# Altium schematic symbol library CUSTOM SCH - Copy.SchLib: 494 symbols (part 3 of 6) (continued)
## RK860 (continued)
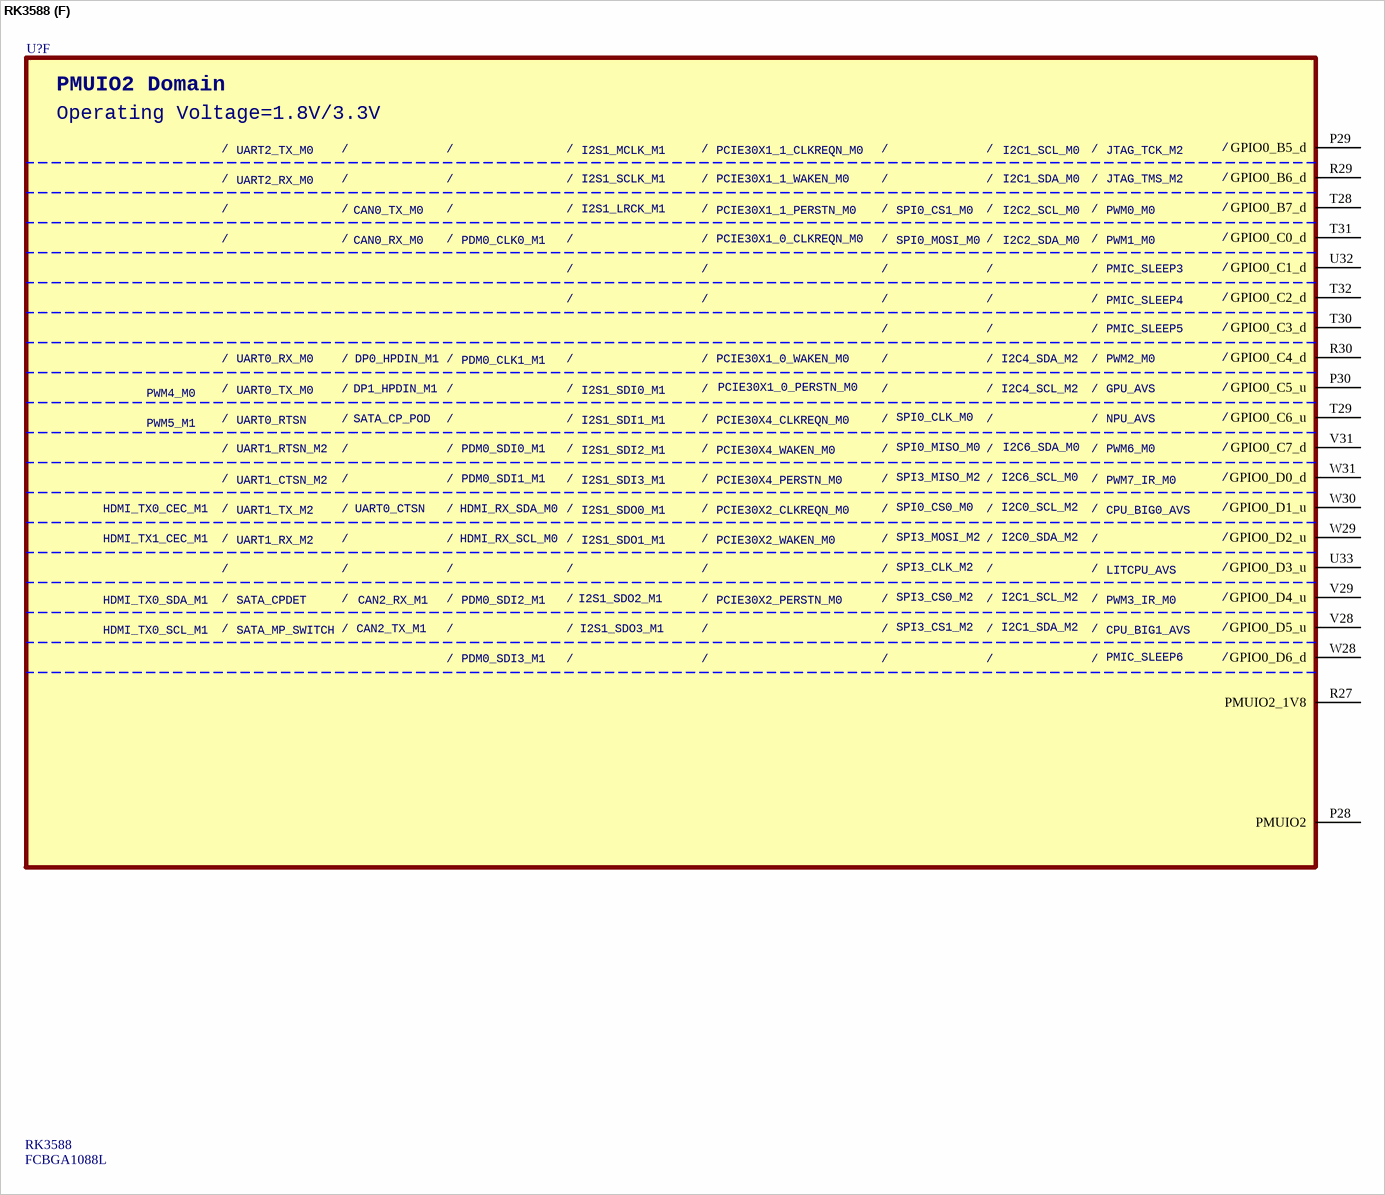
[diagram p25: symbol RK3588]

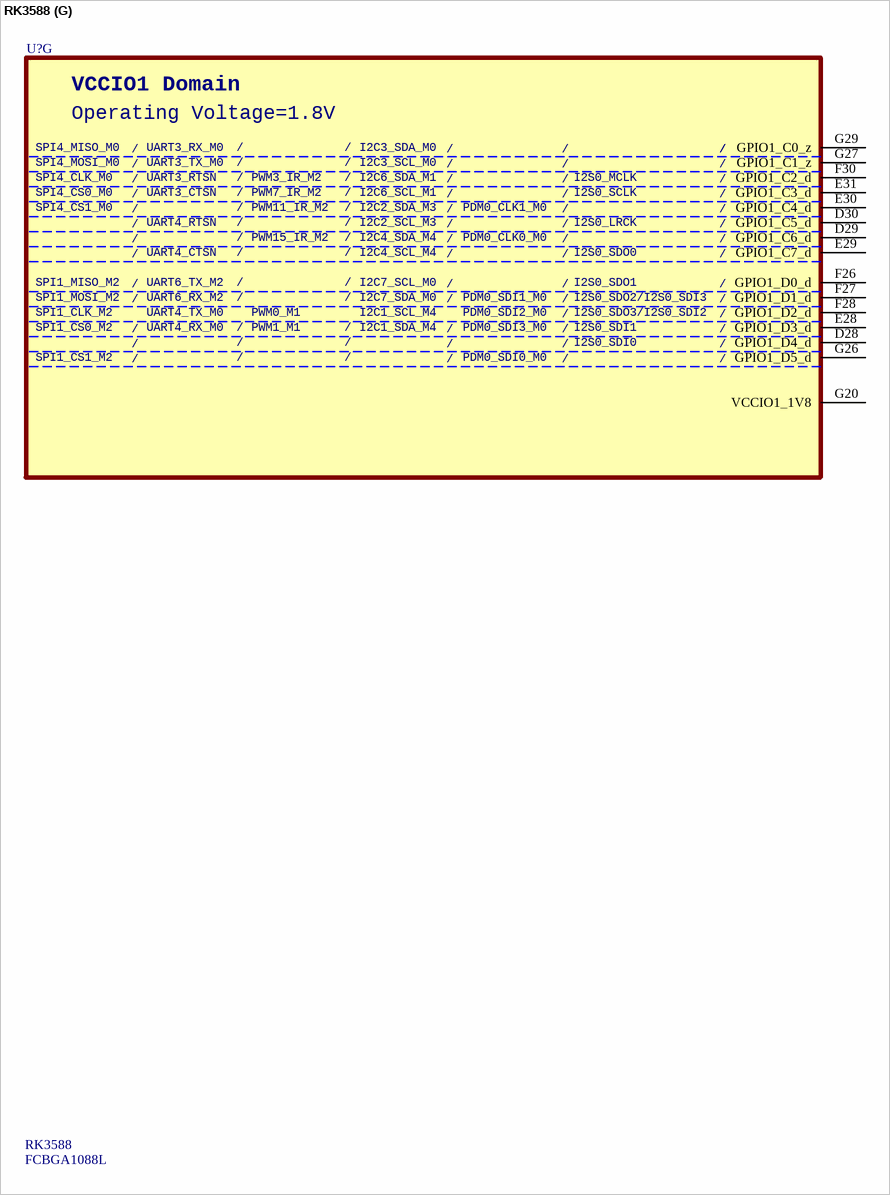
[diagram p26: symbol RK3588]

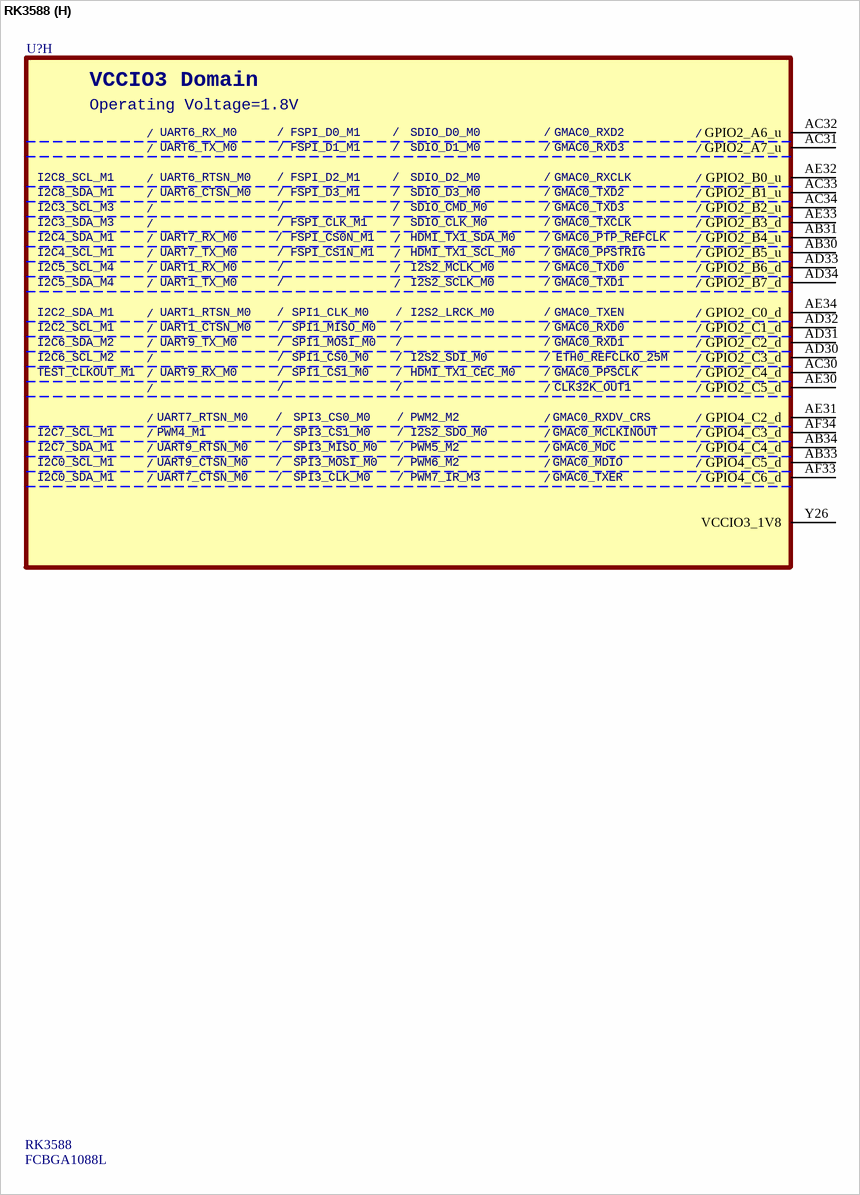
[diagram p27: symbol RK3588]

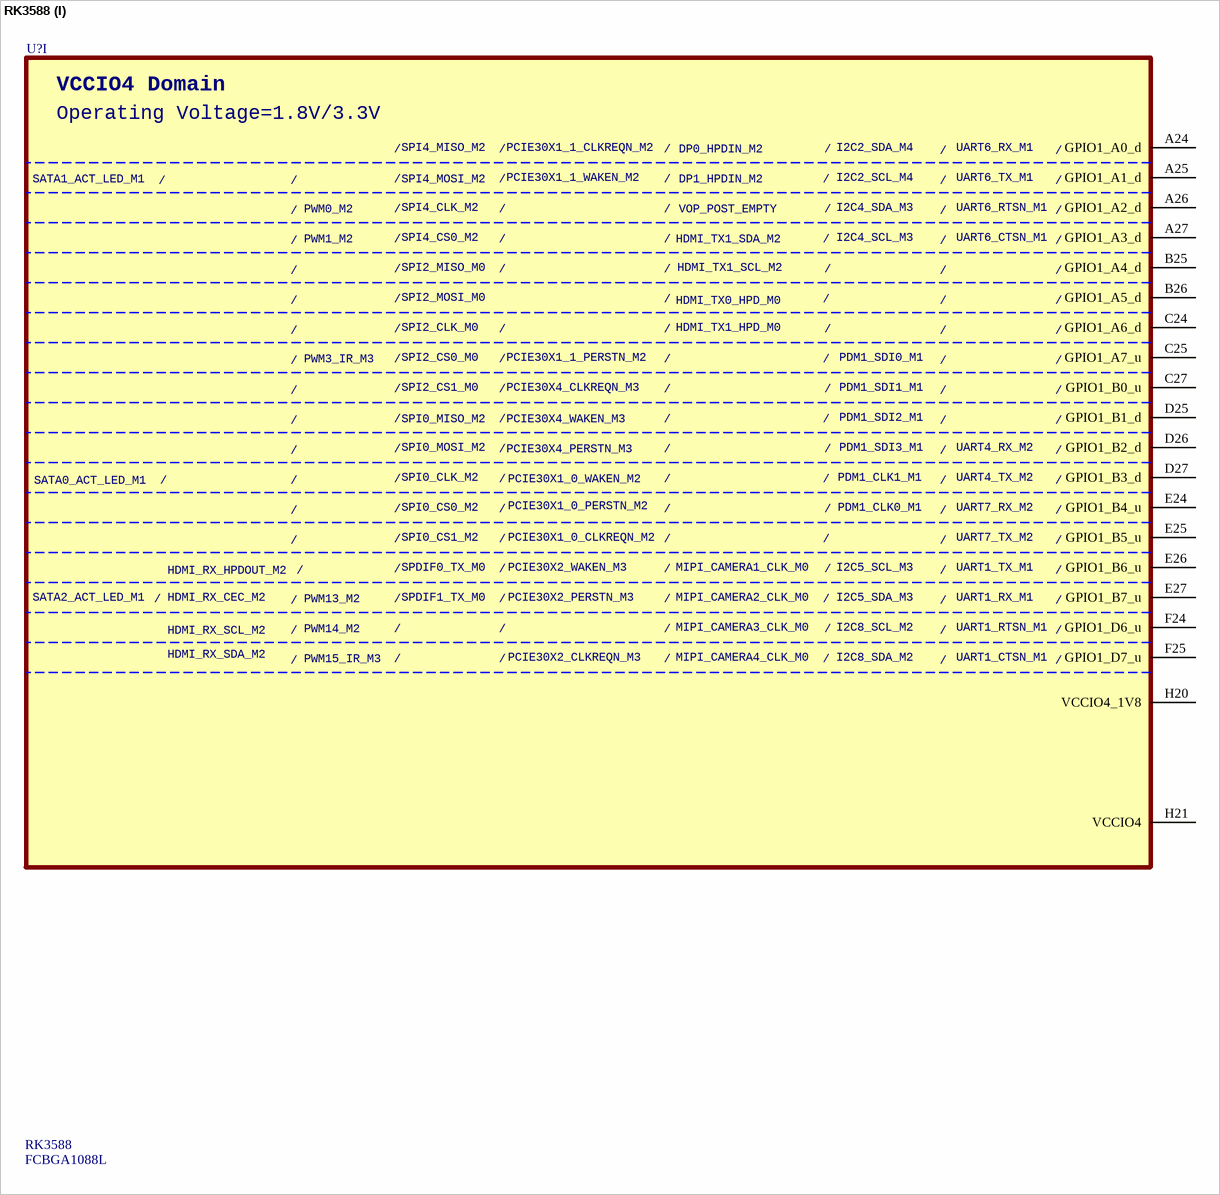
[diagram p28: symbol RK3588]

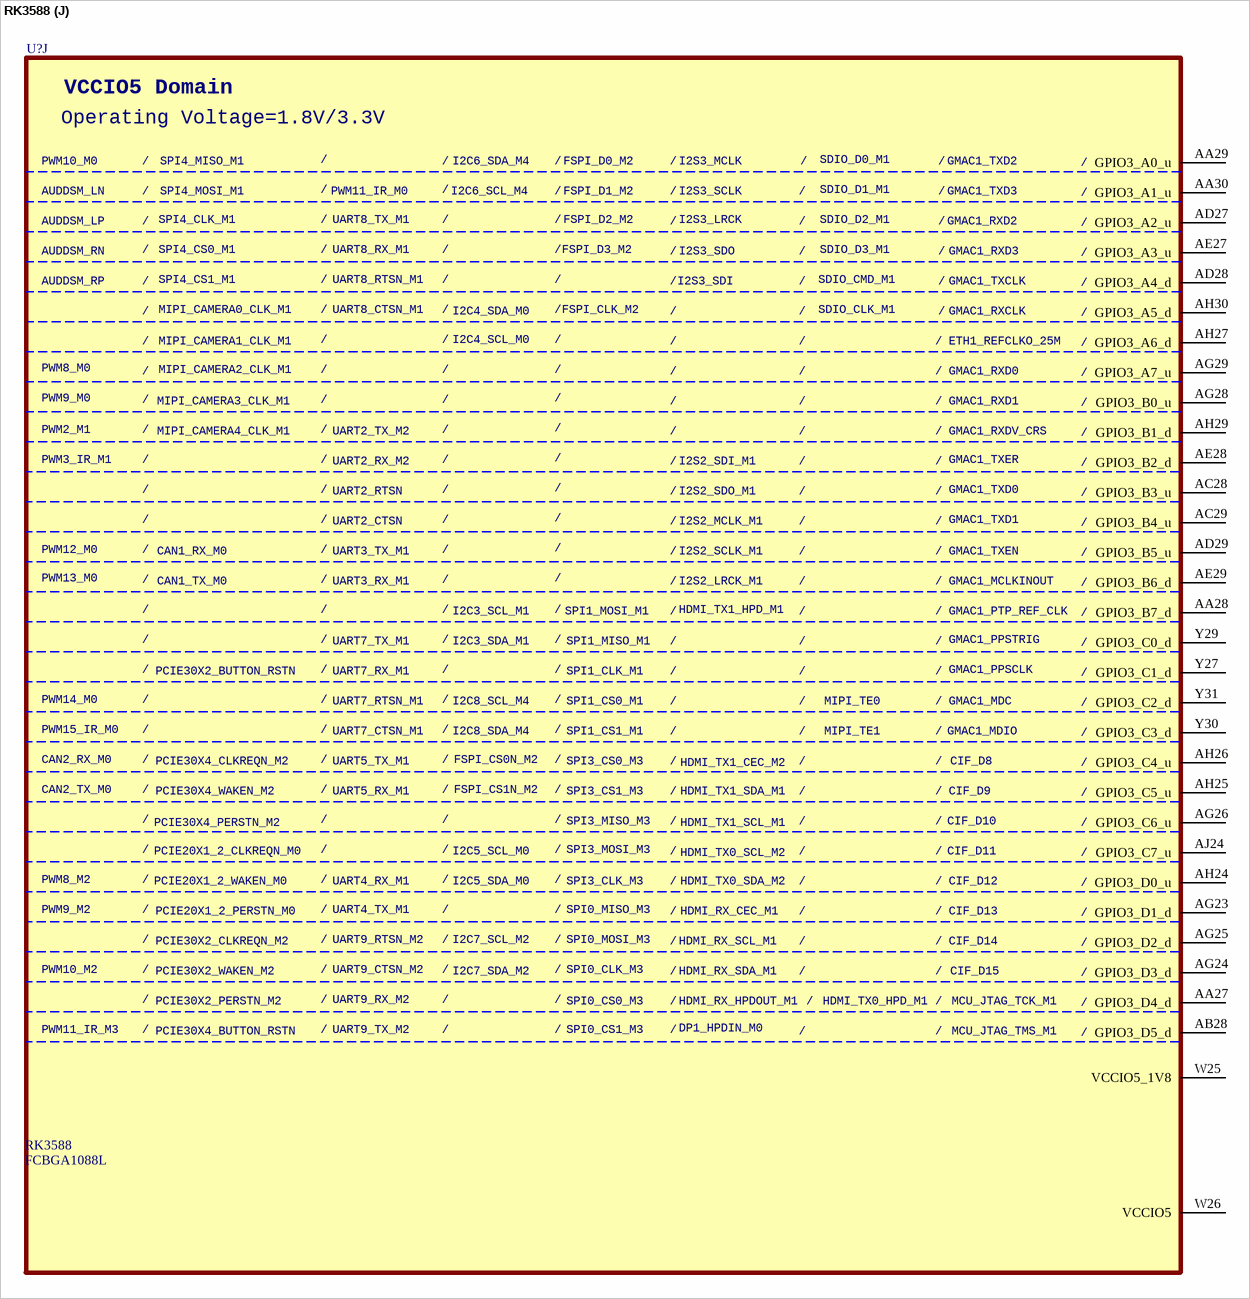
[diagram p29: symbol RK3588]

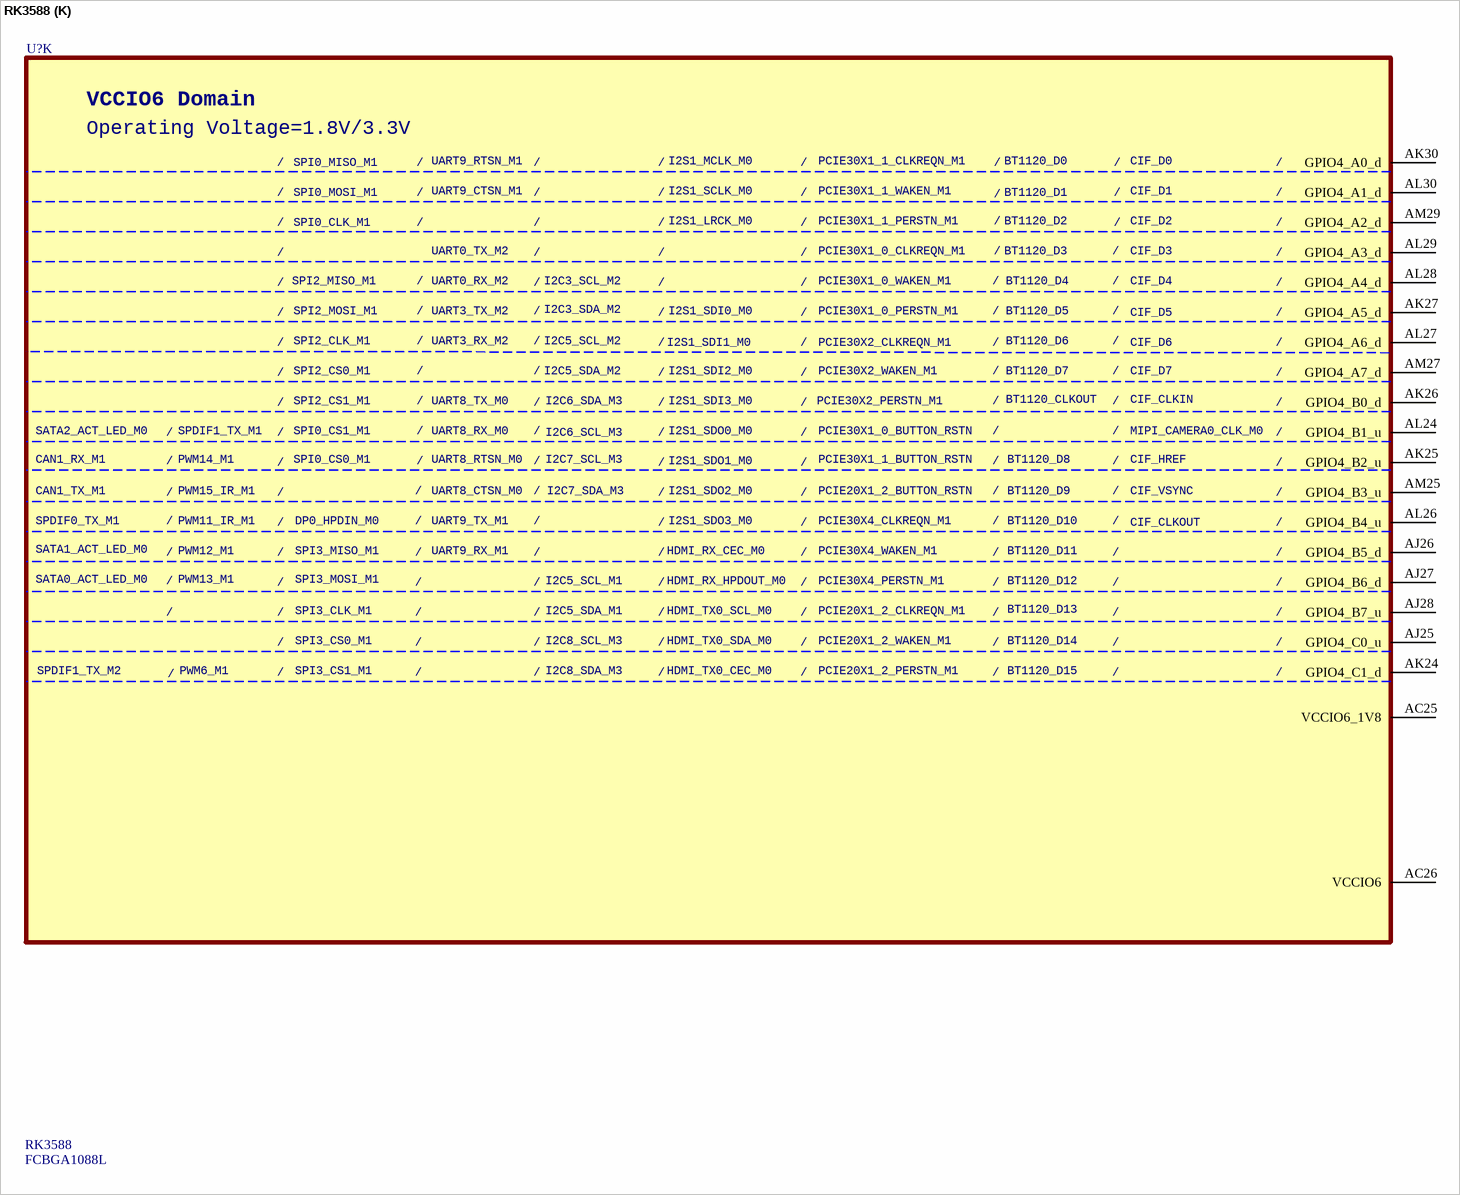
[diagram p30: symbol RK3588]

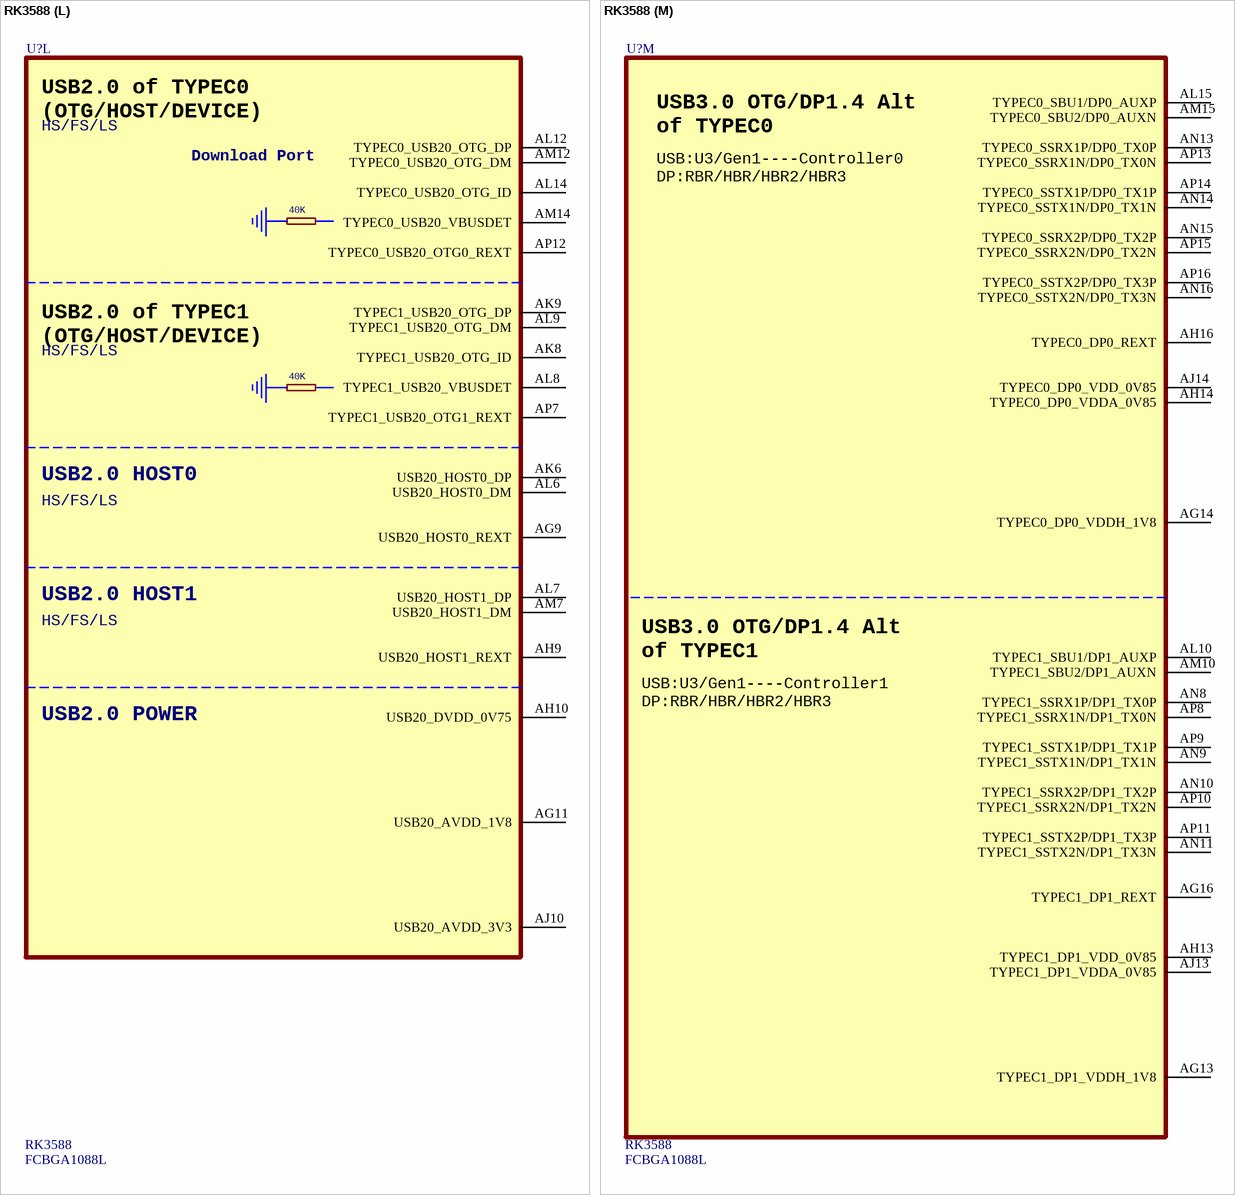
[diagram p31: symbol RK3588]

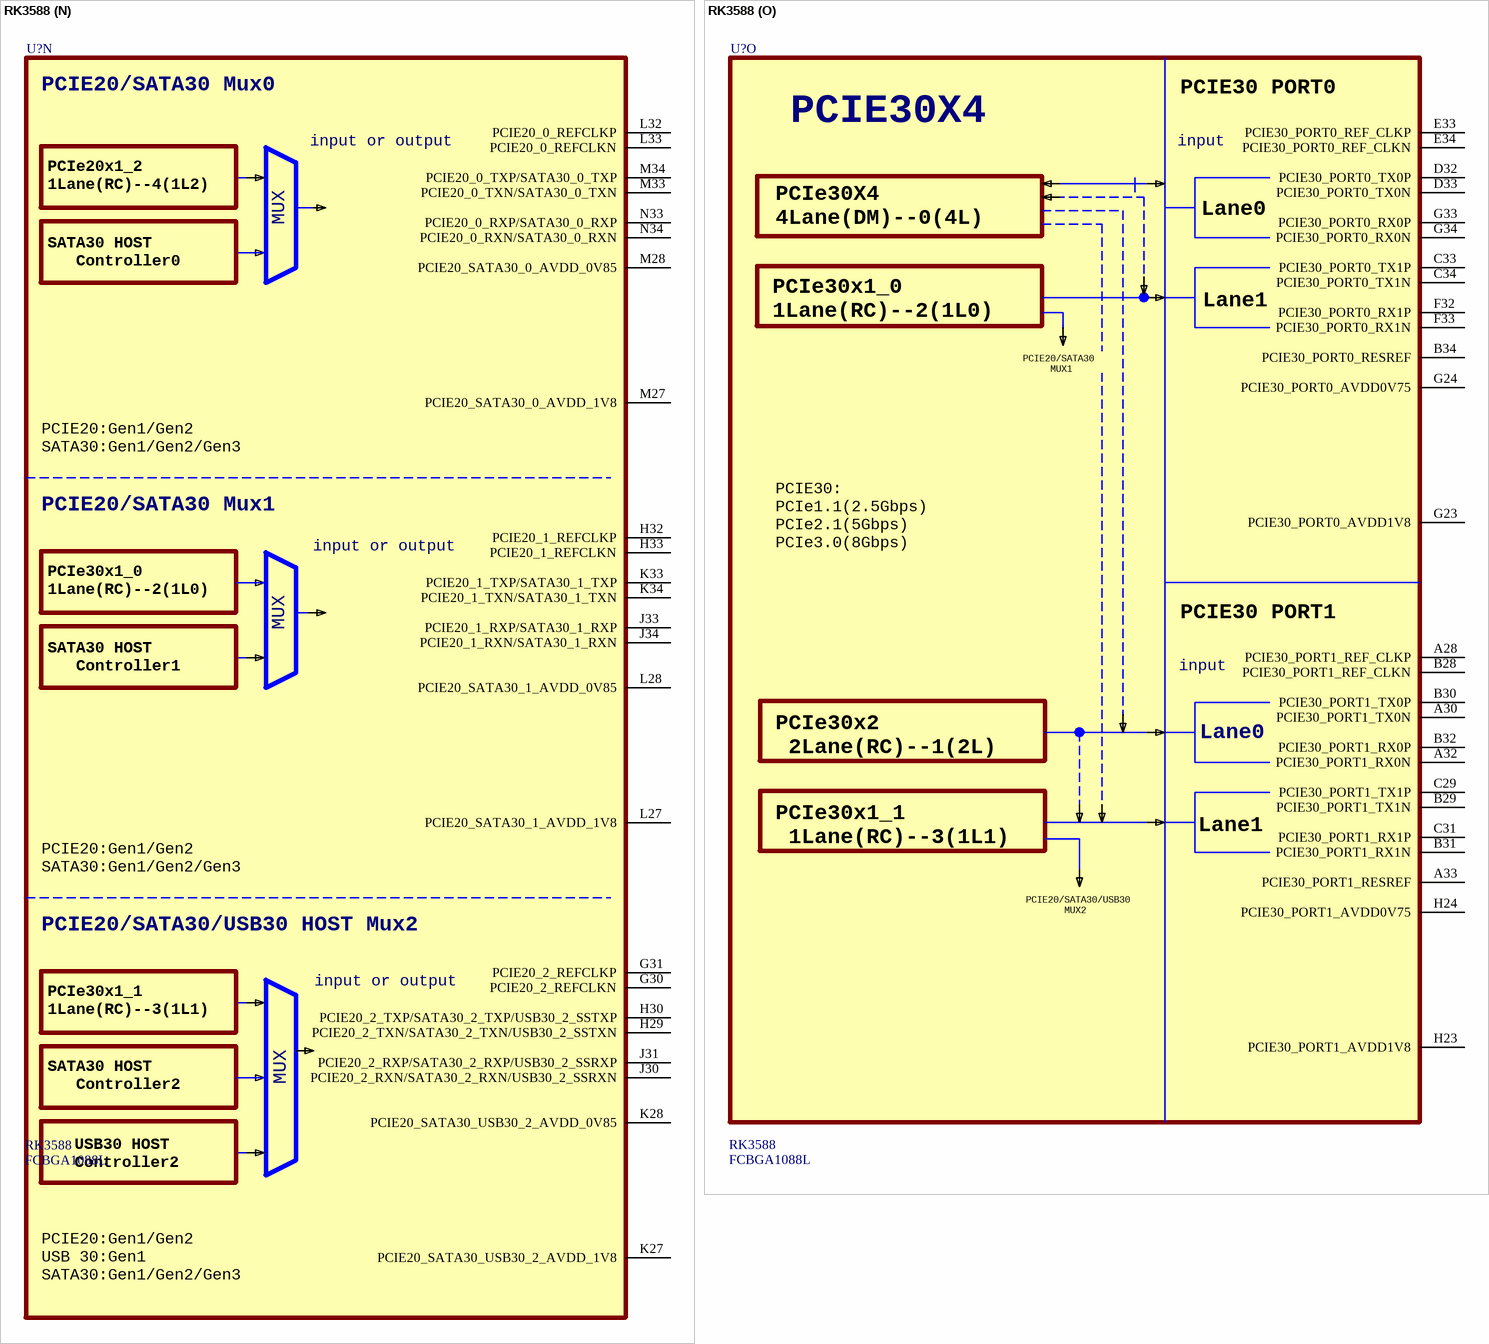
[diagram p32: symbol RK3588]

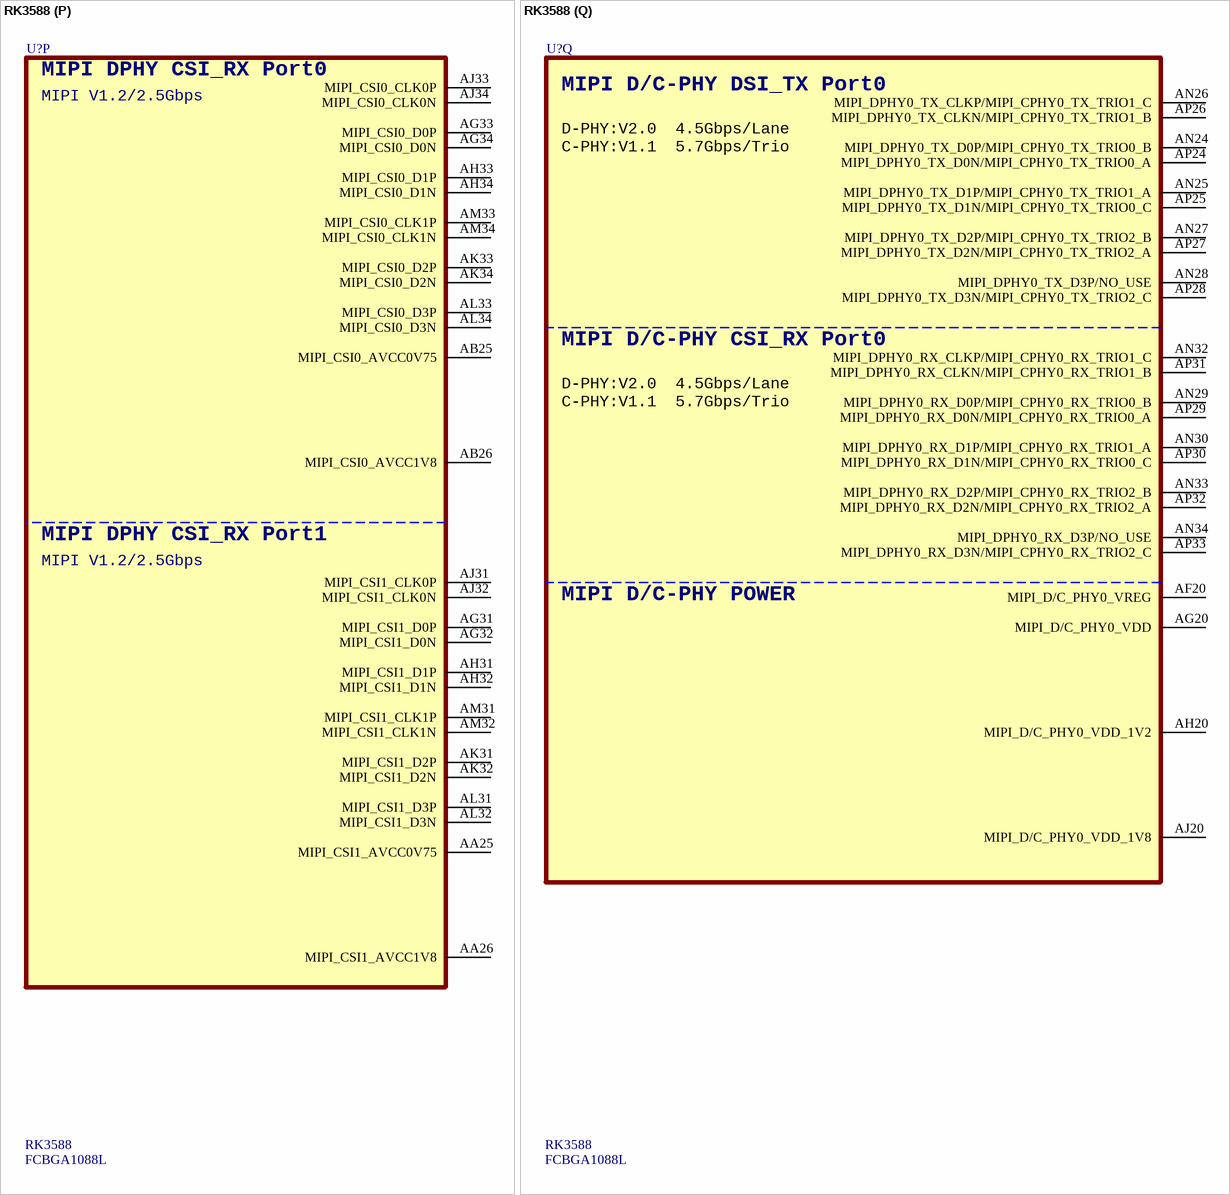
[diagram p33: symbol RK3588]

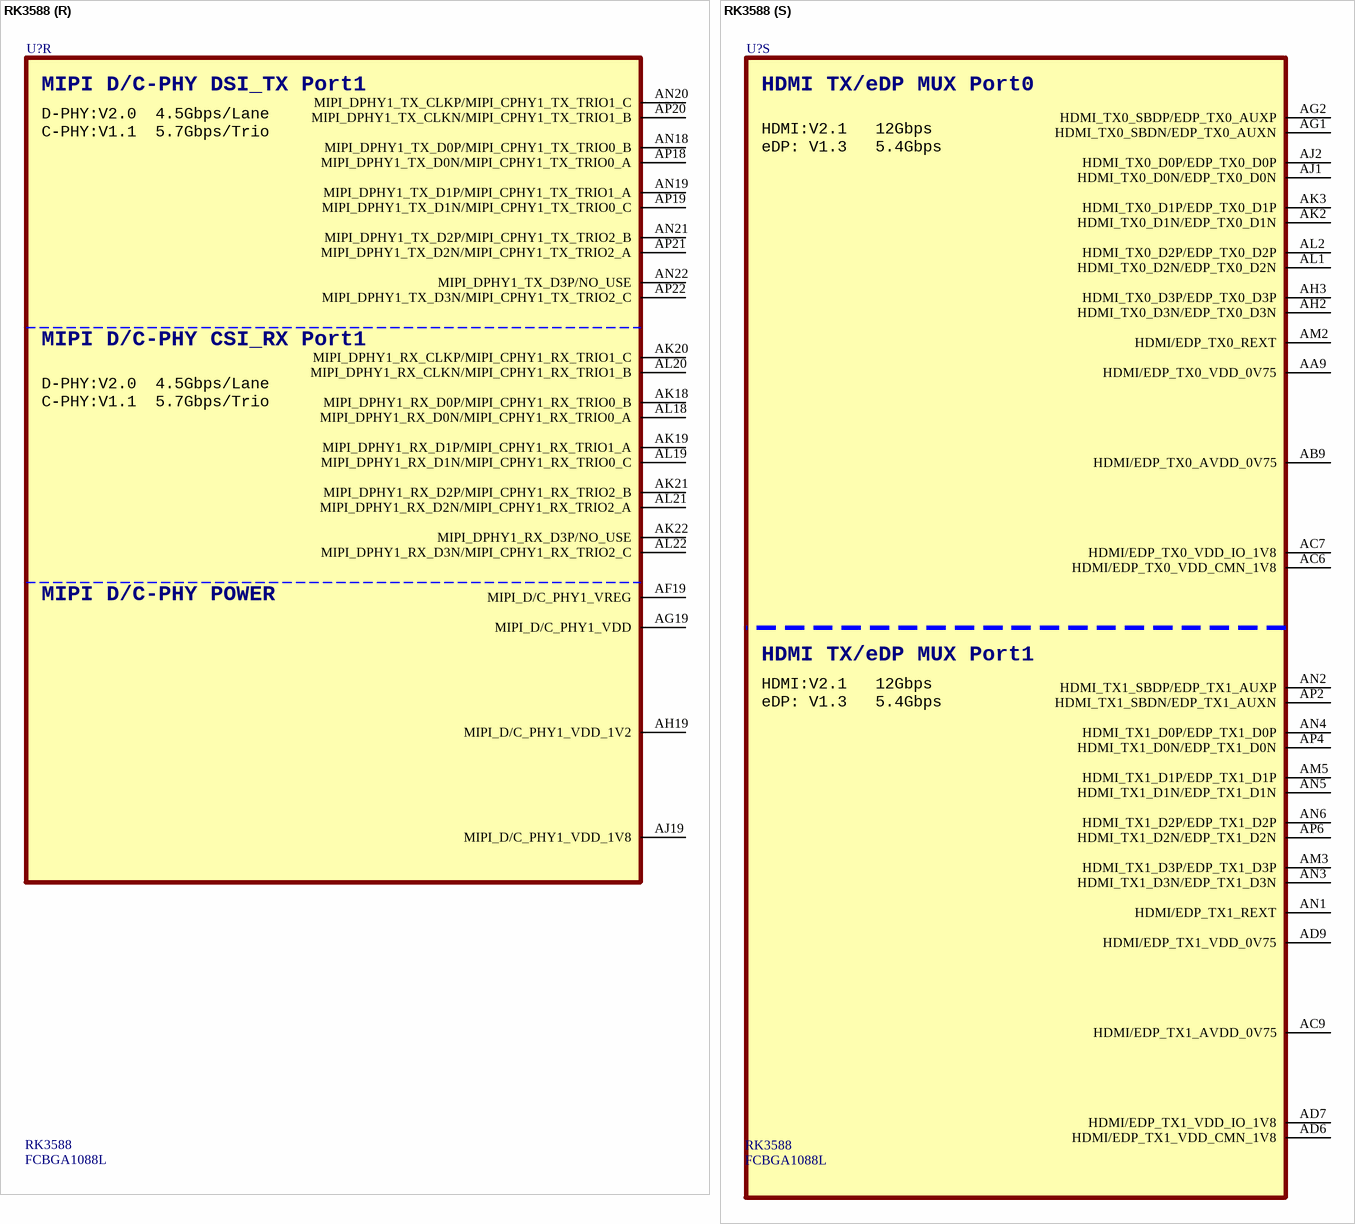
[diagram p34: symbol RK3588]

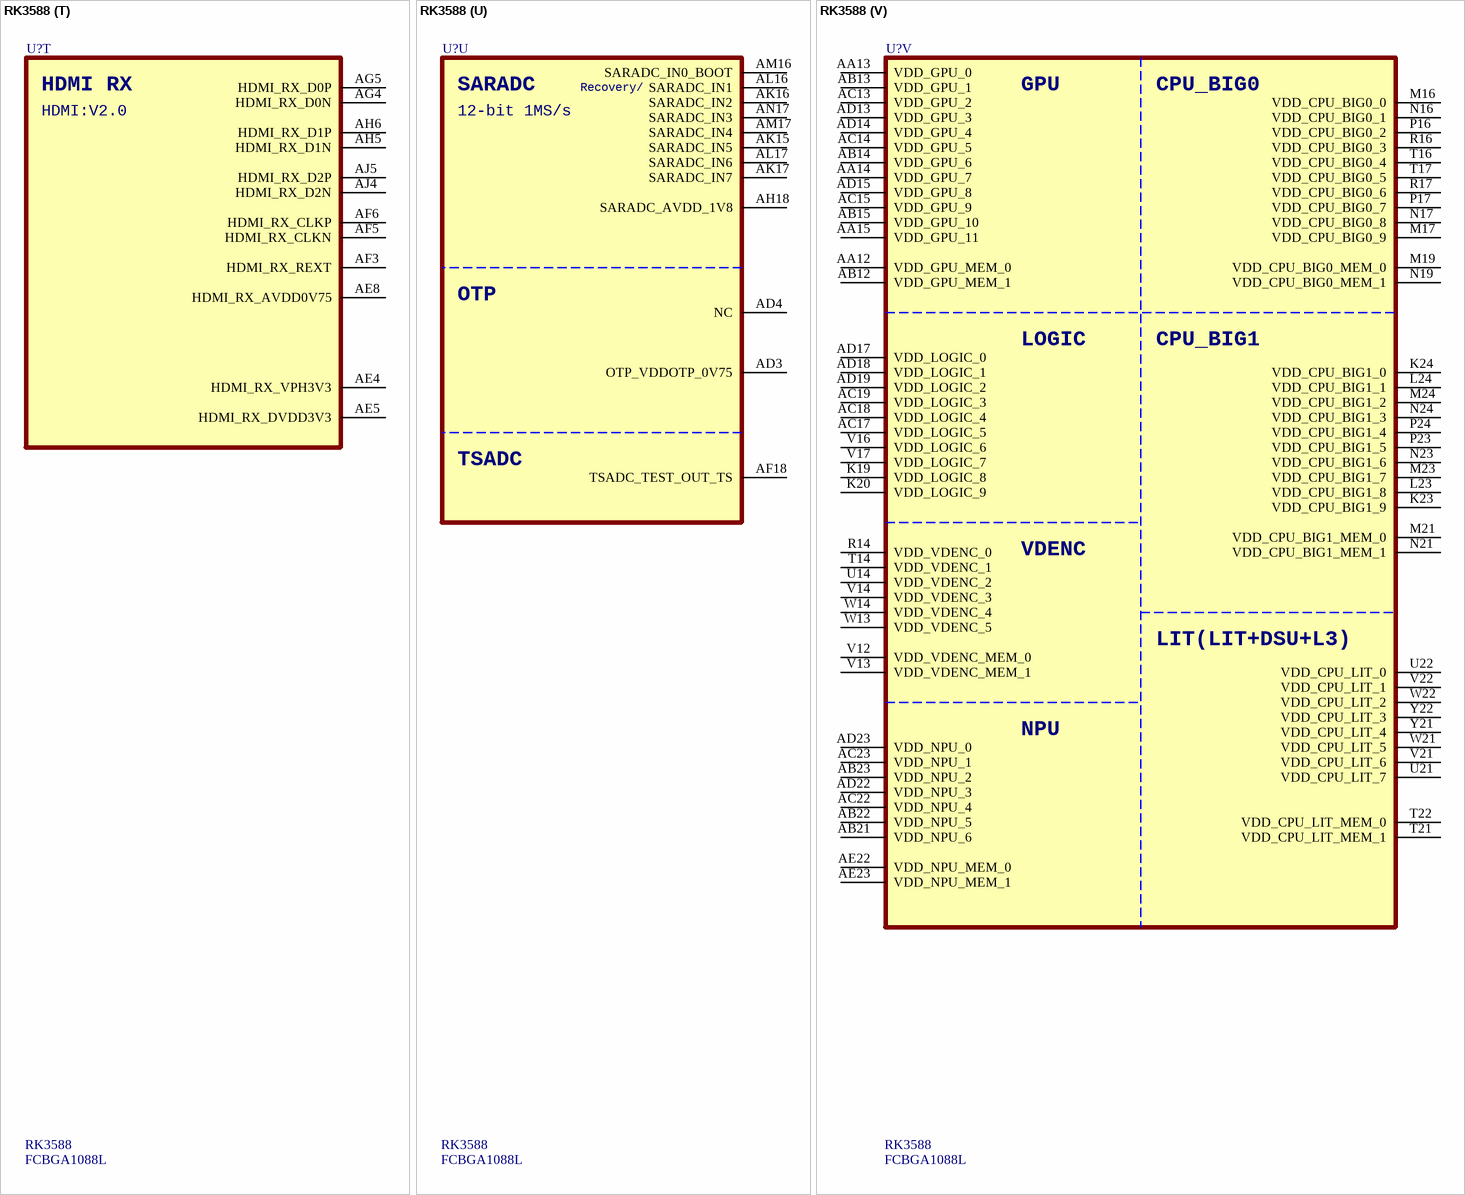
[diagram p35: symbol RK3588]

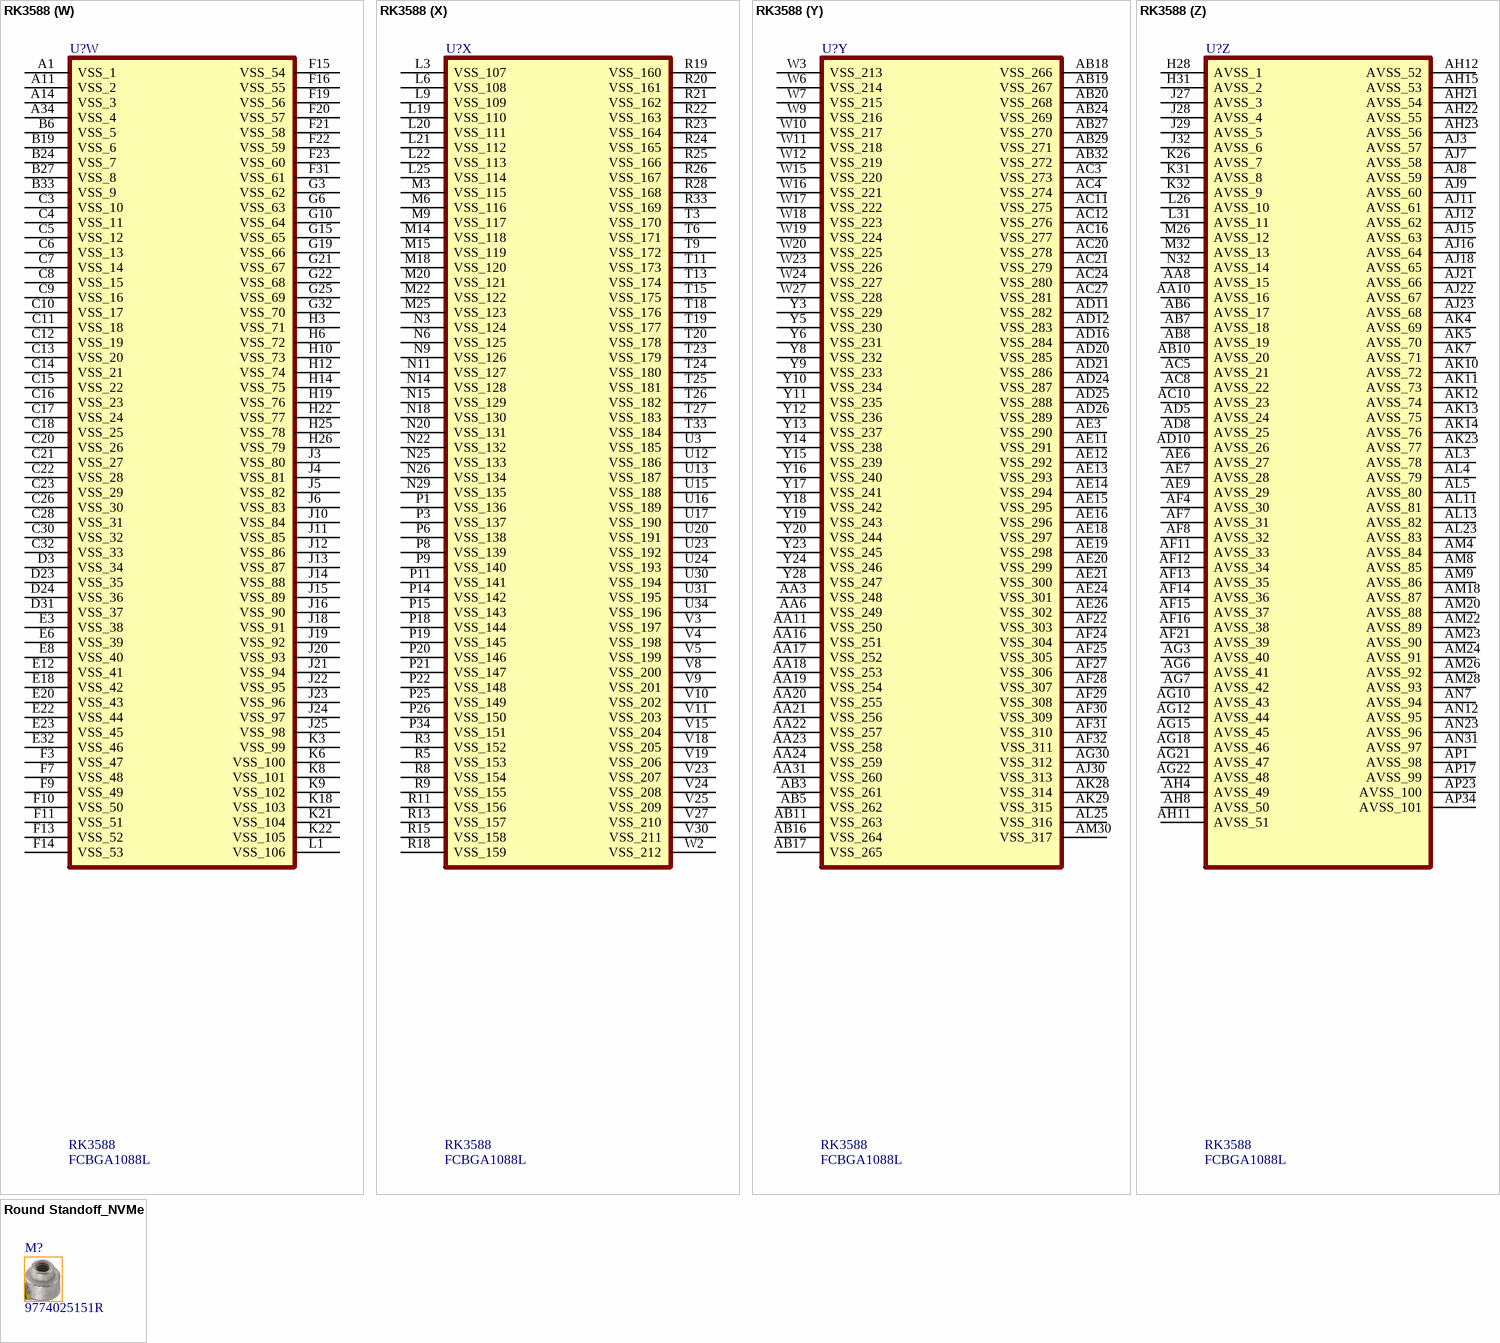
[diagram p36: symbols RK3588 to Round Standoff_NVMe]